# Altium footprint library MYLIB.PcbLib: 600 footprints (part 7 of 39)
Each footprint in its own frame and in the unit in brackets; x right, y up, seen from the top. Pads: shape width x height; smd on the part's side, far side on the other; paste and mask are expansions set on the pad; w line width, h text height; cw(c..) or ccw(c..) is an arc to the next point about the centre after c.
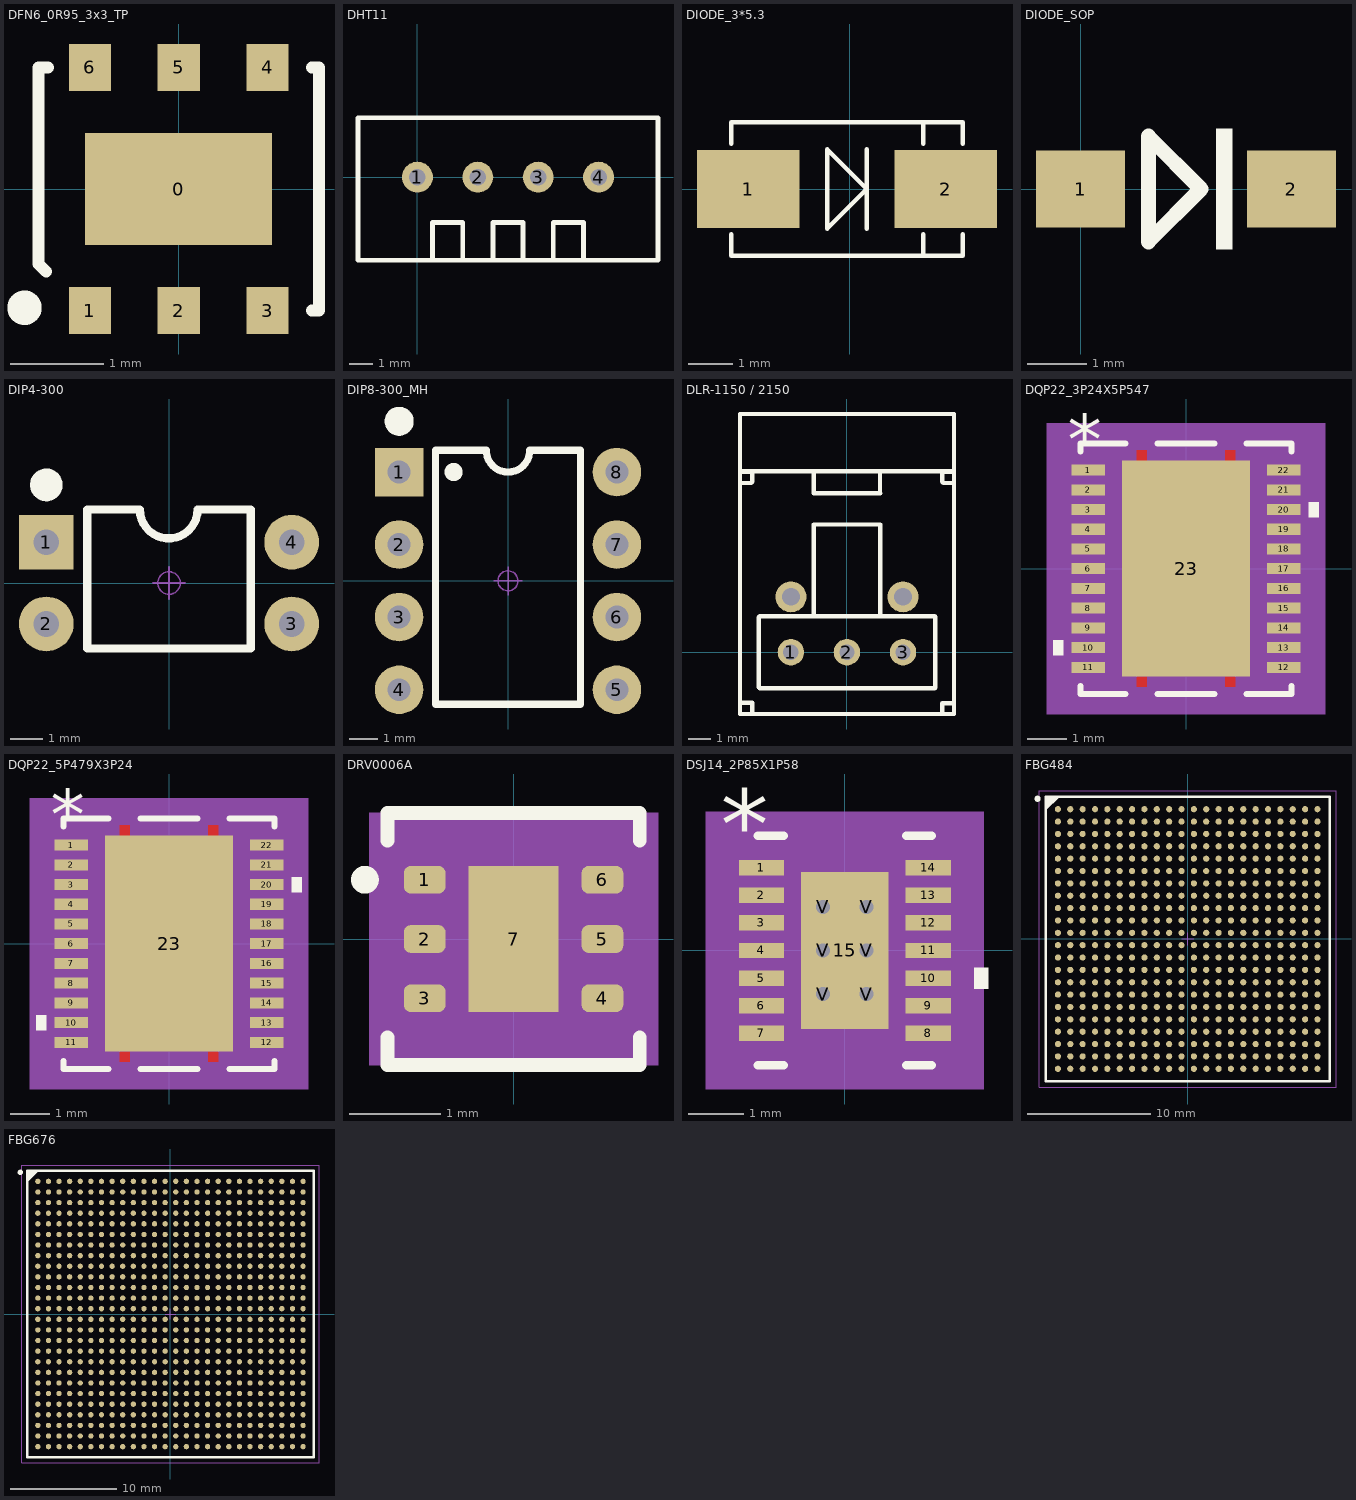
[diagram p6: the footprints below, top view; thin cyan lines are the x and y axes]

## DFN6_0R95_3x3_TP [mm] "500 mA low quiescent current and low noise voltage regulator"
height 1
pads (7):
  rect 2x1.2 smd: 0(0,0)
  rect 0.45x0.5 smd: 1(-0.95,-1.3) 2(0,-1.3) 3(0.95,-1.3) 4(0.95,1.3) 5(0,1.3) 6(-0.95,1.3)
Top Overlay:
  circle w0.25: c-1.649,-1.27 r0.059
  lines w0.127: -1.417,-0.883 -1.5,-0.8 -1.5,1.3 -1.397,1.3 ; 1.422,-1.3 1.5,-1.3 1.5,1.3 1.422,1.3
3D body: height 1, standoff 0.05, extent -1.5,-1.5 1.5,1.5

## DHT11 [mm]
pads (4):
  round 1.3 hole 0.7: 1(0,0) 2(2.54,0) 3(5.08,0) 4(7.62,0)
Top Overlay:
  lines w0.203: -2.5,-3.5 7.62,-3.5 10.12,-3.5 ; -2.5,-3.46 -2.5,0 -2.5,2.5 7.62,2.5 10.12,2.5 10.12,0 10.12,-3.46 ; 0.635,-3.5 0.635,-1.905 1.905,-1.905 1.905,-3.5 ; 3.175,-3.5 3.175,-1.905 4.445,-1.905 4.445,-3.5 ; 5.715,-3.5 5.715,-1.905 6.985,-1.905 6.985,-3.5

## DIODE_3*5.3 [mm]
pads (2):
  rect 2.3x1.75 smd: 1(-2.286,0) 2(2.159,0)
Top Overlay:
  lines w0.1: -2.667,-1.016 -2.667,-1.5 2.54,-1.5 2.54,-1.016 ; -2.667,1.016 -2.667,1.5 2.54,1.5 2.54,1.016 ; 0.381,-0.889 0.381,0.889 ; 1.651,-1.5 1.651,-1.016 ; 1.651,1.016 1.651,1.5 ; -0.508,-0.889 -0.508,0.889 0.381,0 -0.508,-0.889

## DIODE_SOP [mm]
pads (2):
  rect 1.5x1.3 smd: 1(0,0) 2(3.556,0)
Top Overlay:
  rectangle: 2.286,-1.016 2.559,1.016
  lines w0.254: 1.143,-0.889 2.032,0 1.143,0.889 1.143,-0.889

## DIP4-300 [mm] "4.6*7.6*3.8(长宽高）"
pads (4):
  rect 1.7x1.7 hole 0.8: 1(-3.81,1.27)
  round 1.7 hole 0.8: 2(-3.81,-1.27) 3(3.81,-1.27) 4(3.81,1.27)
Top Overlay:
  circle w0.508: c-3.81,3.048 r0.254
  lines w0.254: -2.54,-2.032 2.54,-2.032 2.54,2.286 0.889,2.286 cw(c-0.009,2.286) -0.907,2.286 -2.54,2.286 -2.54,-2.032
Mechanical 15:
  circle w0.05: c0,0 r0.35
  lines w0.05: -0.5,0 0.5,0 ; 0,-0.5 0,0.5
3D body "DIP4-300.STEP": height 4.5, standoff -3.29, extent -3.935,-2.29 3.935,2.29

## DIP8-300_MH [mm] "带底座 9.4*7.6*3.8(长宽高）"
pads (8):
  rect 1.7x1.7 hole 0.8: 1(-3.81,3.81)
  round 1.7 hole 0.8: 2(-3.81,1.27) 3(-3.81,-1.27) 4(-3.81,-3.81) 5(3.81,-3.81) 6(3.81,-1.27) 7(3.81,1.27) 8(3.81,3.81)
Top Overlay:
  circle w0.508: c-3.81,5.588 r0.254
  circle w0.381: c-1.905,3.81 r0.127
  lines w0.254: -2.54,-4.318 -2.54,4.572 -0.762,4.572 ccw(c0,4.572) 0,3.81 ccw(c0,4.572) 0.762,4.572 2.54,4.572 2.54,-4.318 -2.54,-4.318
Mechanical 15:
  circle w0.05: c0,0 r0.35
  lines w0.05: -0.5,0 0.5,0 ; 0,-0.5 0,0.5
3D body "DIP8-300.STEP": height 7.7, standoff 0, extent -3.925,-4.7 3.925,4.7
3D body "DIP-MH8-300.STEP": height 4.95, standoff -2.95, extent -5,-5.19 5,5.19

## DLR-1150 / 2150 [mm]
pads (5):
  round 1.2 hole 0.7: 1(-2.54,0) 2(0,0) 3(2.54,0)
  round 1.4 hole 0.8: ""(-2.54,2.51) ""(2.54,2.51)
Top Overlay:
  lines w0.2: -4.85,8.2 4.85,8.2 ; -4.801,8.179 -4.318,8.179 -4.293,8.153 -4.293,7.722 -4.343,7.671 -4.75,7.671 ; -4.75,-2.286 -4.293,-2.286 -4.293,-2.718 ; -1.5,7.2 1.5,7.2 ; -1.499,1.626 -1.499,5.791 1.5,5.791 1.5,1.626 ; -1.499,7.2 -1.499,8.204 ; 1.499,7.2 1.499,8.204 ; 3.988,1.626 -3.962,1.626 -4,1.588 -4,-1.588 -3.962,-1.626 3.988,-1.626 4,-1.613 4,1.6 ; 4.318,-2.794 4.318,-2.311 4.851,-2.311 ; 4.75,7.671 4.369,7.671 4.318,7.722 4.318,8.153 4.343,8.179 4.826,8.179 ; -4.85,-2.8 4.85,-2.8 4.85,10.8 -4.85,10.8 -4.85,-2.8

## DQP22_3P24X5P547 [mm]
pads (23):
  rect 0.85x0.28 smd: 1(-2.475,2.5) 2(-2.475,2) 3(-2.475,1.5) 4(-2.475,1) 5(-2.475,0.5) 6(-2.475,0) 7(-2.475,-0.5) 8(-2.475,-1) 9(-2.475,-1.5) 10(-2.475,-2) 11(-2.475,-2.5) 12(2.475,-2.5) 13(2.475,-2) 14(2.475,-1.5) 15(2.475,-1) 16(2.475,-0.5) 17(2.475,0) 18(2.475,0.5) 19(2.475,1) 20(2.475,1.5) 21(2.475,2) 22(2.475,2.5)
  rect 3.24x5.479 smd paste-2.727 mask-2.73: 23(0,0)
Top Layer:
  region: 1.25,-2.739 1,-2.739 1,-3 1.25,-3
  region: -1.25,-2.739 -1,-2.739 -1,-3 -1.25,-3
  region: -1.25,2.739 -1,2.739 -1,3 -1.25,3
  region: 1.25,2.739 1,2.739 1,3 1.25,3
  region: 0,-2.739
  region: 0,2.739
Top Overlay:
  region: 3.109,1.69 3.363,1.69 3.363,1.309 3.109,1.309
  region: -3.109,-1.81 -3.363,-1.81 -3.363,-2.191 -3.109,-2.191
  lines w0.152: -2.677,-2.973 -2.677,-3.177 -1.531,-3.177 ; -2.677,2.973 -2.677,3.177 -1.531,3.177 ; -0.719,-3.177 0.719,-3.177 ; -0.719,3.177 0.719,3.177 ; 1.531,-3.177 2.677,-3.177 2.677,-2.973 ; 1.531,3.177 2.677,3.177 2.677,2.973
  text "*" at -3.001,2.653 h1.27
Top Paste:
  drawing of 63 lines, arcs and shapes, not listed
Top Solder:
  drawing of 40 lines, arcs and shapes, not listed
Mechanical 5:
  region: 3.535,-3.685 -3.535,-3.685 -3.535,3.685 3.535,3.685
Mechanical 13:
  lines w0: -0.305,3.05 ccw(c0,3.05) 0.305,3.05
  lines w0.025: -2.55,-2.625 -2.55,-2.625 ; -2.55,-2.625 -2.55,-2.375 ; -2.55,-2.625 -2.55,-2.375 ; -2.55,-2.375 -2.55,-2.375 ; -2.55,-2.125 -2.55,-2.125 ; -2.55,-2.125 -2.55,-1.875 ; -2.55,-2.125 -2.55,-1.875 ; -2.55,-1.875 -2.55,-1.875 ; -2.55,-1.625 -2.55,-1.625 ; -2.55,-1.625 -2.55,-1.375 ; -2.55,-1.625 -2.55,-1.375 ; -2.55,-1.375 -2.55,-1.375 ; -2.55,-1.125 -2.55,-1.125 ; -2.55,-1.125 -2.55,-0.875 ; -2.55,-1.125 -2.55,-0.875 ; -2.55,-0.875 -2.55,-0.875 ; -2.55,-0.625 -2.55,-0.625 ; -2.55,-0.625 -2.55,-0.375 ; -2.55,-0.625 -2.55,-0.375 ; -2.55,-0.375 -2.55,-0.375 ; -2.55,-0.125 -2.55,-0.125 ; -2.55,-0.125 -2.55,0.125 ; -2.55,-0.125 -2.55,0.125 ; -2.55,0.125 -2.55,0.125 ; -2.55,0.375 -2.55,0.375 ; -2.55,0.375 -2.55,0.625 ; -2.55,0.375 -2.55,0.625 ; -2.55,0.625 -2.55,0.625 ; -2.55,0.875 -2.55,0.875 ; -2.55,0.875 -2.55,1.125 ; -2.55,0.875 -2.55,1.125 ; -2.55,1.125 -2.55,1.125 ; -2.55,1.375 -2.55,1.375 ; -2.55,1.375 -2.55,1.625 ; -2.55,1.375 -2.55,1.625 ; -2.55,1.625 -2.55,1.625 ; -2.55,1.875 -2.55,1.875 ; -2.55,1.875 -2.55,2.125 ; -2.55,1.875 -2.55,2.125 ; -2.55,2.125 -2.55,2.125 ; -2.55,2.375 -2.55,2.375 ; -2.55,2.375 -2.55,2.625 ; -2.55,2.375 -2.55,2.625 ; -2.55,2.625 -2.55,2.625 ; 2.55,-2.625 2.55,-2.375 ; 2.55,-2.625 2.55,-2.625 ; 2.55,-2.625 2.55,-2.375 ; 2.55,-2.375 2.55,-2.375 ; 2.55,-2.125 2.55,-1.875 ; 2.55,-2.125 2.55,-2.125 ; 2.55,-2.125 2.55,-1.875 ; 2.55,-1.875 2.55,-1.875 ; 2.55,-1.625 2.55,-1.375 ; 2.55,-1.625 2.55,-1.625 ; 2.55,-1.625 2.55,-1.375 ; 2.55,-1.375 2.55,-1.375 ; 2.55,-1.125 2.55,-0.875 ; 2.55,-1.125 2.55,-1.125 ; 2.55,-1.125 2.55,-0.875 ; 2.55,-0.875 2.55,-0.875 ; 2.55,-0.625 2.55,-0.375 ; 2.55,-0.625 2.55,-0.625 ; 2.55,-0.625 2.55,-0.375 ; 2.55,-0.375 2.55,-0.375 ; 2.55,-0.125 2.55,0.125 ; 2.55,-0.125 2.55,-0.125 ; 2.55,-0.125 2.55,0.125 ; 2.55,0.125 2.55,0.125 ; 2.55,0.375 2.55,0.625 ; 2.55,0.375 2.55,0.375 ; 2.55,0.375 2.55,0.625 ; 2.55,0.625 2.55,0.625 ; 2.55,0.875 2.55,1.125 ; 2.55,0.875 2.55,0.875 ; 2.55,0.875 2.55,1.125 ; 2.55,1.125 2.55,1.125 ; 2.55,1.375 2.55,1.625 ; 2.55,1.375 2.55,1.375 ; 2.55,1.375 2.55,1.625 ; 2.55,1.625 2.55,1.625 ; 2.55,1.875 2.55,2.125 ; 2.55,1.875 2.55,1.875 ; 2.55,1.875 2.55,2.125 ; 2.55,2.125 2.55,2.125 ; 2.55,2.375 2.55,2.625 ; 2.55,2.375 2.55,2.375 ; 2.55,2.375 2.55,2.625 ; 2.55,2.625 2.55,2.625 ; -2.55,-3.05 -2.55,3.05 2.55,3.05 2.55,-3.05 -2.55,-3.05
  text "*" at -2.613,1.51 h1.27
Mechanical 15:
  region: -2.804,-2.894 -3.154,-2.894 -3.154,2.894 -2.804,2.894 -2.804,3.304 2.804,3.304 2.804,2.894 3.154,2.894 3.154,-2.894 2.804,-2.894 2.804,-3.304 -2.804,-3.304
  lines w0.152: -3.154,-2.894 -2.804,-2.894 -2.804,-3.304 2.804,-3.304 2.804,-2.894 3.154,-2.894 3.154,2.894 2.804,2.894 2.804,3.304 -2.804,3.304 -2.804,2.894 -3.154,2.894 -3.154,-2.894
Mechanical 16:
  circle w0.127: c1.181,1.968 r0.191
  circle w0.127: c1.181,1.181 r0.191
  circle w0.127: c1.181,0.394 r0.191
  circle w0.127: c1.181,-0.394 r0.191
  circle w0.127: c1.181,-1.181 r0.191
  circle w0.127: c1.181,-1.968 r0.191
  circle w0.127: c0.394,1.968 r0.191
  circle w0.127: c0.394,1.181 r0.191
  circle w0.127: c0.394,0.394 r0.191
  circle w0.127: c0.394,-0.394 r0.191
  circle w0.127: c0.394,-1.181 r0.191
  circle w0.127: c0.394,-1.968 r0.191
  circle w0.127: c-0.394,1.968 r0.191
  circle w0.127: c-0.394,1.181 r0.191
  circle w0.127: c-0.394,0.394 r0.191
  circle w0.127: c-0.394,-0.394 r0.191
  circle w0.127: c-0.394,-1.181 r0.191
  circle w0.127: c-0.394,-1.968 r0.191
  circle w0.127: c-1.181,1.968 r0.191
  circle w0.127: c-1.181,1.181 r0.191
  circle w0.127: c-1.181,0.394 r0.191
  circle w0.127: c-1.181,-0.394 r0.191
  circle w0.127: c-1.181,-1.181 r0.191
  circle w0.127: c-1.181,-1.968 r0.191
3D body: height 0.25, standoff 0, extent 0,0 0.254,0.254

## DQP22_5P479X3P24 [mm]
pads (23):
  rect 0.85x0.28 smd: 1(-2.475,2.5) 2(-2.475,2) 3(-2.475,1.5) 4(-2.475,1) 5(-2.475,0.5) 6(-2.475,0) 7(-2.475,-0.5) 8(-2.475,-1) 9(-2.475,-1.5) 10(-2.475,-2) 11(-2.475,-2.5) 12(2.475,-2.5) 13(2.475,-2) 14(2.475,-1.5) 15(2.475,-1) 16(2.475,-0.5) 17(2.475,0) 18(2.475,0.5) 19(2.475,1) 20(2.475,1.5) 21(2.475,2) 22(2.475,2.5)
  rect 3.24x5.479 smd paste-2.727 mask-2.73: 23(0,0)
Top Layer:
  region: 0,2.739
  region: 0,-2.739
  region: 1.25,2.739 1,2.739 1,3 1.25,3
  region: -1.25,2.739 -1,2.739 -1,3 -1.25,3
  region: -1.25,-2.739 -1,-2.739 -1,-3 -1.25,-3
  region: 1.25,-2.739 1,-2.739 1,-3 1.25,-3
Top Overlay:
  region: -3.109,-1.81 -3.363,-1.81 -3.363,-2.191 -3.109,-2.191
  region: 3.109,1.69 3.363,1.69 3.363,1.309 3.109,1.309
  lines w0.152: -2.677,-2.973 -2.677,-3.177 -1.531,-3.177 ; -2.677,2.973 -2.677,3.177 -1.531,3.177 ; -0.719,-3.177 0.719,-3.177 ; -0.719,3.177 0.719,3.177 ; 1.531,-3.177 2.677,-3.177 2.677,-2.973 ; 1.531,3.177 2.677,3.177 2.677,2.973
  text "*" at -3.001,2.653 h1.27
Top Paste:
  drawing of 63 lines, arcs and shapes, not listed
Top Solder:
  drawing of 40 lines, arcs and shapes, not listed
Mechanical 5:
  region: 3.535,-3.685 -3.535,-3.685 -3.535,3.685 3.535,3.685
Mechanical 13:
  lines w0: -0.305,3.05 ccw(c0,3.05) 0.305,3.05
  lines w0.025: -2.55,-2.625 -2.55,-2.375 ; -2.55,-2.625 -2.55,-2.375 ; -2.55,-2.625 -2.55,-2.625 ; -2.55,-2.375 -2.55,-2.375 ; -2.55,-2.125 -2.55,-1.875 ; -2.55,-2.125 -2.55,-1.875 ; -2.55,-2.125 -2.55,-2.125 ; -2.55,-1.875 -2.55,-1.875 ; -2.55,-1.625 -2.55,-1.375 ; -2.55,-1.625 -2.55,-1.375 ; -2.55,-1.625 -2.55,-1.625 ; -2.55,-1.375 -2.55,-1.375 ; -2.55,-1.125 -2.55,-0.875 ; -2.55,-1.125 -2.55,-0.875 ; -2.55,-1.125 -2.55,-1.125 ; -2.55,-0.875 -2.55,-0.875 ; -2.55,-0.625 -2.55,-0.375 ; -2.55,-0.625 -2.55,-0.375 ; -2.55,-0.625 -2.55,-0.625 ; -2.55,-0.375 -2.55,-0.375 ; -2.55,-0.125 -2.55,0.125 ; -2.55,-0.125 -2.55,0.125 ; -2.55,-0.125 -2.55,-0.125 ; -2.55,0.125 -2.55,0.125 ; -2.55,0.375 -2.55,0.625 ; -2.55,0.375 -2.55,0.625 ; -2.55,0.375 -2.55,0.375 ; -2.55,0.625 -2.55,0.625 ; -2.55,0.875 -2.55,1.125 ; -2.55,0.875 -2.55,1.125 ; -2.55,0.875 -2.55,0.875 ; -2.55,1.125 -2.55,1.125 ; -2.55,1.375 -2.55,1.625 ; -2.55,1.375 -2.55,1.625 ; -2.55,1.375 -2.55,1.375 ; -2.55,1.625 -2.55,1.625 ; -2.55,1.875 -2.55,2.125 ; -2.55,1.875 -2.55,2.125 ; -2.55,1.875 -2.55,1.875 ; -2.55,2.125 -2.55,2.125 ; -2.55,2.375 -2.55,2.625 ; -2.55,2.375 -2.55,2.625 ; -2.55,2.375 -2.55,2.375 ; -2.55,2.625 -2.55,2.625 ; 2.55,-2.625 2.55,-2.375 ; 2.55,-2.625 2.55,-2.625 ; 2.55,-2.625 2.55,-2.375 ; 2.55,-2.375 2.55,-2.375 ; 2.55,-2.125 2.55,-1.875 ; 2.55,-2.125 2.55,-2.125 ; 2.55,-2.125 2.55,-1.875 ; 2.55,-1.875 2.55,-1.875 ; 2.55,-1.625 2.55,-1.375 ; 2.55,-1.625 2.55,-1.625 ; 2.55,-1.625 2.55,-1.375 ; 2.55,-1.375 2.55,-1.375 ; 2.55,-1.125 2.55,-0.875 ; 2.55,-1.125 2.55,-1.125 ; 2.55,-1.125 2.55,-0.875 ; 2.55,-0.875 2.55,-0.875 ; 2.55,-0.625 2.55,-0.375 ; 2.55,-0.625 2.55,-0.625 ; 2.55,-0.625 2.55,-0.375 ; 2.55,-0.375 2.55,-0.375 ; 2.55,-0.125 2.55,0.125 ; 2.55,-0.125 2.55,-0.125 ; 2.55,-0.125 2.55,0.125 ; 2.55,0.125 2.55,0.125 ; 2.55,0.375 2.55,0.625 ; 2.55,0.375 2.55,0.375 ; 2.55,0.375 2.55,0.625 ; 2.55,0.625 2.55,0.625 ; 2.55,0.875 2.55,1.125 ; 2.55,0.875 2.55,0.875 ; 2.55,0.875 2.55,1.125 ; 2.55,1.125 2.55,1.125 ; 2.55,1.375 2.55,1.625 ; 2.55,1.375 2.55,1.375 ; 2.55,1.375 2.55,1.625 ; 2.55,1.625 2.55,1.625 ; 2.55,1.875 2.55,2.125 ; 2.55,1.875 2.55,1.875 ; 2.55,1.875 2.55,2.125 ; 2.55,2.125 2.55,2.125 ; 2.55,2.375 2.55,2.625 ; 2.55,2.375 2.55,2.375 ; 2.55,2.375 2.55,2.625 ; 2.55,2.625 2.55,2.625 ; -2.55,-3.05 2.55,-3.05 2.55,3.05 -2.55,3.05 -2.55,-3.05
  text "*" at -2.613,1.51 h1.27
Mechanical 15:
  region: -2.804,-2.894 -3.154,-2.894 -3.154,2.894 -2.804,2.894 -2.804,3.304 2.804,3.304 2.804,2.894 3.154,2.894 3.154,-2.894 2.804,-2.894 2.804,-3.304 -2.804,-3.304
  lines w0.152: -3.154,-2.894 -3.154,2.894 -2.804,2.894 -2.804,3.304 2.804,3.304 2.804,2.894 3.154,2.894 3.154,-2.894 2.804,-2.894 2.804,-3.304 -2.804,-3.304 -2.804,-2.894 -3.154,-2.894
Mechanical 16:
  circle w0.127: c-1.181,-1.968 r0.191
  circle w0.127: c-1.181,-1.181 r0.191
  circle w0.127: c-1.181,-0.394 r0.191
  circle w0.127: c-1.181,0.394 r0.191
  circle w0.127: c-1.181,1.181 r0.191
  circle w0.127: c-1.181,1.968 r0.191
  circle w0.127: c-0.394,-1.968 r0.191
  circle w0.127: c-0.394,-1.181 r0.191
  circle w0.127: c-0.394,-0.394 r0.191
  circle w0.127: c-0.394,0.394 r0.191
  circle w0.127: c-0.394,1.181 r0.191
  circle w0.127: c-0.394,1.968 r0.191
  circle w0.127: c0.394,-1.968 r0.191
  circle w0.127: c0.394,-1.181 r0.191
  circle w0.127: c0.394,-0.394 r0.191
  circle w0.127: c0.394,0.394 r0.191
  circle w0.127: c0.394,1.181 r0.191
  circle w0.127: c0.394,1.968 r0.191
  circle w0.127: c1.181,-1.968 r0.191
  circle w0.127: c1.181,-1.181 r0.191
  circle w0.127: c1.181,-0.394 r0.191
  circle w0.127: c1.181,0.394 r0.191
  circle w0.127: c1.181,1.181 r0.191
  circle w0.127: c1.181,1.968 r0.191
3D body: height 0.25, standoff 0, extent 0,0 0.254,0.254

## DRV0006A [mil]
pads (7):
  rrect50% 18x12 smd paste+0 mask+2: 1(-38.39,25.59) 2(-38.39,0) 3(-38.39,-25.59) 4(38.39,-25.59) 5(38.39,0) 6(38.39,25.59)
  rect 39x63 smd paste-31 mask-31: 7(0,0)
Top Layer:
  region: 0,31.5
  region: 0,-31.5
Top Overlay:
  circle w6: c-64.18,25.59 r3
  lines w6: -54.5,-42.59 -54.5,-54.5 54.5,-54.5 54.5,-42.59 ; -54.5,42.59 -54.5,54.5 54.5,54.5 54.5,42.59
Top Paste:
  region: -29.39,31.59 -47.39,31.59 -47.39,19.59 -29.39,19.59
  region: -29.39,6 -47.39,6 -47.39,-6 -29.39,-6
  region: -29.39,-19.59 -47.39,-19.59 -47.39,-31.59 -29.39,-31.59
  region: 47.39,-19.59 29.39,-19.59 29.39,-31.59 47.39,-31.59
  region: 47.39,6 29.39,6 29.39,-6 47.39,-6
  region: 47.39,31.59 29.39,31.59 29.39,19.59 47.39,19.59
  region: -3.94,28.55 -16.55,28.55 -16.55,19.44 -9.5,19.44 -3.94,25
  region: -9.5,11.56 -16.55,11.56 -16.55,-11.56 -9.5,-11.56 -3.94,-6 -3.94,6
  region: -9.5,-19.44 -16.55,-19.44 -16.55,-28.55 -3.94,-28.55 -3.94,-25
  region: 16.55,28.55 3.94,28.55 3.94,25 9.5,19.44 16.55,19.44
  region: 16.55,11.56 9.5,11.56 3.94,6 3.94,-6 9.5,-11.56 16.55,-11.56
  region: 16.55,-19.44 9.5,-19.44 3.94,-25 3.94,-28.55 16.55,-28.55
Top Solder:
  region: -29.39,31.59 -47.39,31.59 -47.39,19.59 -29.39,19.59
  region: -29.39,6 -47.39,6 -47.39,-6 -29.39,-6
  region: -29.39,-19.59 -47.39,-19.59 -47.39,-31.59 -29.39,-31.59
  region: 47.39,-19.59 29.39,-19.59 29.39,-31.59 47.39,-31.59
  region: 47.39,6 29.39,6 29.39,-6 47.39,-6
  region: 47.39,31.59 29.39,31.59 29.39,19.59 47.39,19.59
  region: -22,23.37 -22,34 22,34 22,23.37
  region: -22,-7.63 -22,7.63 22,7.63 22,-7.63
  region: -22,-34 -22,-23.37 22,-23.37 22,-34
  region: -22,-34 -22,34 -7.87,34 -7.87,-34
  region: 7.87,-34 7.87,34 22,34 22,-34
  region: 0,31.5
  region: 0,-31.5
Mechanical 5:
  region: 62.39,-54.5 -62.39,-54.5 -62.39,54.5 62.39,54.5
Mechanical 13:
  circle w0: c-29.39,25.59 r3
  lines w0: -12,39.5 ccw(c0,39.5) 12,39.5
  lines w1: -39.5,-39.5 39.5,-39.5 39.5,39.5 -39.5,39.5 -39.5,-39.5
Mechanical 15:
  region: -49.5,-40.39 -57.39,-40.39 -57.39,40.39 -49.5,40.39 -49.5,49.5 49.5,49.5 49.5,40.39 57.39,40.39 57.39,-40.39 49.5,-40.39 49.5,-49.5 -49.5,-49.5
  lines w6: -57.39,-40.39 -57.39,40.39 -49.5,40.39 -49.5,49.5 49.5,49.5 49.5,40.39 57.39,40.39 57.39,-40.39 49.5,-40.39 49.5,-49.5 -49.5,-49.5 -49.5,-40.39 -57.39,-40.39
Mechanical 16:
  circle w0: c0,-21.66 r4
  circle w0: c0,21.66 r4
3D body: height 10, standoff 0, extent 0,0 10,10

## DSJ14_2P85X1P58 [mm]
pads (21):
  rect 0.82x0.28 smd paste-0.397: 1(-1.51,1.5) 2(-1.51,1) 3(-1.51,0.5) 4(-1.51,0) 5(-1.51,-0.5) 6(-1.51,-1) 7(-1.51,-1.5) 8(1.51,-1.5) 9(1.51,-1) 10(1.51,-0.5) 11(1.51,0) 12(1.51,0.5) 13(1.51,1) 14(1.51,1.5)
  rect 1.58x2.85 smd paste-1.412 mask-1.41: 15(0,0)
  round 0.508 hole 0.254: V(-0.394,-0.787) V(-0.394,0) V(-0.394,0.787) V(0.394,-0.787) V(0.394,0) V(0.394,0.787)
Top Overlay:
  region: 2.337,-0.309 2.591,-0.309 2.591,-0.69 2.337,-0.69
  lines w0.152: -1.575,-2.075 -1.11,-2.075 ; -1.575,2.075 -1.11,2.075 ; 1.11,-2.075 1.575,-2.075 ; 1.11,2.075 1.575,2.075
  text "*" at -2.244,1.653 h1.27
Top Paste:
  drawing of 26 lines, arcs and shapes, not listed
Top Solder:
  region: 0.594,-1.488 0.594,1.488 0.854,1.488 0.854,-1.488
  region: 0.194,-1.488 0.194,1.488 -0.194,1.488 -0.194,-1.488
  region: -0.854,-1.488 -0.854,1.488 -0.594,1.488 -0.594,-1.488
  region: -0.854,-1.488 -0.854,-0.987 0.854,-0.987 0.854,-1.488
  region: -0.854,-0.587 -0.854,-0.2 0.854,-0.2 0.854,-0.587
  region: -0.854,0.2 -0.854,0.587 0.854,0.587 0.854,0.2
  region: -0.854,0.987 -0.854,1.488 0.854,1.488 0.854,0.987
  region: 1.92,1.64 1.1,1.64 1.1,1.36 1.92,1.36
  region: 1.92,1.14 1.1,1.14 1.1,0.86 1.92,0.86
  region: 1.92,0.64 1.1,0.64 1.1,0.36 1.92,0.36
  region: 1.92,0.14 1.1,0.14 1.1,-0.14 1.92,-0.14
  region: 1.92,-0.36 1.1,-0.36 1.1,-0.64 1.92,-0.64
  region: 1.92,-0.86 1.1,-0.86 1.1,-1.14 1.92,-1.14
  region: 1.92,-1.36 1.1,-1.36 1.1,-1.64 1.92,-1.64
  region: -1.1,-1.36 -1.92,-1.36 -1.92,-1.64 -1.1,-1.64
  region: -1.1,-0.86 -1.92,-0.86 -1.92,-1.14 -1.1,-1.14
  region: -1.1,-0.36 -1.92,-0.36 -1.92,-0.64 -1.1,-0.64
  region: -1.1,0.14 -1.92,0.14 -1.92,-0.14 -1.1,-0.14
  region: -1.1,0.64 -1.92,0.64 -1.92,0.36 -1.1,0.36
  region: -1.1,1.14 -1.92,1.14 -1.92,0.86 -1.1,0.86
  region: -1.1,1.64 -1.92,1.64 -1.92,1.36 -1.1,1.36
Mechanical 5:
  region: 2.515,-2.507 -2.515,-2.507 -2.515,2.507 2.515,2.507
Mechanical 13:
  lines w0: -0.305,2.075 ccw(c0,2.075) 0.305,2.075
  lines w0.025: -1.575,-2.075 -1.575,2.075 1.575,2.075 1.575,-2.075 -1.575,-2.075 ; -1.575,-1.65 -1.575,-1.35 -1.575,-1.65 ; -1.575,-1.15 -1.575,-0.85 -1.575,-1.15 ; -1.575,-0.65 -1.575,-0.35 -1.575,-0.65 ; -1.575,-0.15 -1.575,0.15 -1.575,-0.15 ; -1.575,0.35 -1.575,0.65 -1.575,0.35 ; -1.575,0.85 -1.575,1.15 -1.575,0.85 ; -1.575,1.35 -1.575,1.65 -1.575,1.35 ; 1.575,-1.65 1.575,-1.35 1.575,-1.65 ; 1.575,-1.15 1.575,-0.85 1.575,-1.15 ; 1.575,-0.65 1.575,-0.35 1.575,-0.65 ; 1.575,-0.15 1.575,0.15 1.575,-0.15 ; 1.575,0.35 1.575,0.65 1.575,0.35 ; 1.575,0.85 1.575,1.15 1.575,0.85 ; 1.575,1.35 1.575,1.65 1.575,1.35
  text "*" at -2.244,1.653 h1.27
Mechanical 15:
  region: 2.134,-2.126 -2.134,-2.126 -2.134,2.126 2.134,2.126
  lines w0.152: -2.134,-2.126 2.134,-2.126 2.134,2.126 -2.134,2.126 -2.134,-2.126
3D body: height 0.25, standoff 0, extent 0,0 0.254,0.254

## FBG484 [mm] "BGA, 484-Balls, Body 23x23mm, Pitch 1.0mm"
height 2.54
pads (484):
  round 0.5 smd: A1(-10.5,10.5) A2(-9.5,10.5) A3(-8.5,10.5) A4(-7.5,10.5) A5(-6.5,10.5) A6(-5.5,10.5) A7(-4.5,10.5) A8(-3.5,10.5) A9(-2.5,10.5) A10(-1.5,10.5) A11(-0.5,10.5) A12(0.5,10.5) A13(1.5,10.5) A14(2.5,10.5) A15(3.5,10.5) A16(4.5,10.5) A17(5.5,10.5) A18(6.5,10.5) A19(7.5,10.5) A20(8.5,10.5) A21(9.5,10.5) A22(10.5,10.5) AA1(-10.5,-9.5) AA2(-9.5,-9.5) AA3(-8.5,-9.5) AA4(-7.5,-9.5) AA5(-6.5,-9.5) AA6(-5.5,-9.5) AA7(-4.5,-9.5) AA8(-3.5,-9.5) AA9(-2.5,-9.5) AA10(-1.5,-9.5) AA11(-0.5,-9.5) AA12(0.5,-9.5) AA13(1.5,-9.5) AA14(2.5,-9.5) AA15(3.5,-9.5) AA16(4.5,-9.5) AA17(5.5,-9.5) AA18(6.5,-9.5) AA19(7.5,-9.5) AA20(8.5,-9.5) AA21(9.5,-9.5) AA22(10.5,-9.5) AB1(-10.5,-10.5) AB2(-9.5,-10.5) AB3(-8.5,-10.5) AB4(-7.5,-10.5) AB5(-6.5,-10.5) AB6(-5.5,-10.5) AB7(-4.5,-10.5) AB8(-3.5,-10.5) AB9(-2.5,-10.5) AB10(-1.5,-10.5) AB11(-0.5,-10.5) AB12(0.5,-10.5) AB13(1.5,-10.5) AB14(2.5,-10.5) AB15(3.5,-10.5) AB16(4.5,-10.5) AB17(5.5,-10.5) AB18(6.5,-10.5) AB19(7.5,-10.5) AB20(8.5,-10.5) AB21(9.5,-10.5) AB22(10.5,-10.5) B1(-10.5,9.5) B2(-9.5,9.5) B3(-8.5,9.5) B4(-7.5,9.5) B5(-6.5,9.5) B6(-5.5,9.5) B7(-4.5,9.5) B8(-3.5,9.5) B9(-2.5,9.5) B10(-1.5,9.5) B11(-0.5,9.5) B12(0.5,9.5) B13(1.5,9.5) B14(2.5,9.5) B15(3.5,9.5) B16(4.5,9.5) B17(5.5,9.5) B18(6.5,9.5) B19(7.5,9.5) B20(8.5,9.5) B21(9.5,9.5) B22(10.5,9.5) C1(-10.5,8.5) C2(-9.5,8.5) C3(-8.5,8.5) C4(-7.5,8.5) C5(-6.5,8.5) C6(-5.5,8.5) C7(-4.5,8.5) C8(-3.5,8.5) C9(-2.5,8.5) C10(-1.5,8.5) C11(-0.5,8.5) C12(0.5,8.5) C13(1.5,8.5) C14(2.5,8.5) C15(3.5,8.5) C16(4.5,8.5) C17(5.5,8.5) C18(6.5,8.5) C19(7.5,8.5) C20(8.5,8.5) C21(9.5,8.5) C22(10.5,8.5) D1(-10.5,7.5) D2(-9.5,7.5) D3(-8.5,7.5) D4(-7.5,7.5) D5(-6.5,7.5) D6(-5.5,7.5) D7(-4.5,7.5) D8(-3.5,7.5) D9(-2.5,7.5) D10(-1.5,7.5) D11(-0.5,7.5) D12(0.5,7.5) D13(1.5,7.5) D14(2.5,7.5) D15(3.5,7.5) D16(4.5,7.5) D17(5.5,7.5) D18(6.5,7.5) D19(7.5,7.5) D20(8.5,7.5) D21(9.5,7.5) D22(10.5,7.5) E1(-10.5,6.5) E2(-9.5,6.5) E3(-8.5,6.5) E4(-7.5,6.5) E5(-6.5,6.5) E6(-5.5,6.5) E7(-4.5,6.5) E8(-3.5,6.5) E9(-2.5,6.5) E10(-1.5,6.5) E11(-0.5,6.5) E12(0.5,6.5) E13(1.5,6.5) E14(2.5,6.5) E15(3.5,6.5) E16(4.5,6.5) E17(5.5,6.5) E18(6.5,6.5) E19(7.5,6.5) E20(8.5,6.5) E21(9.5,6.5) E22(10.5,6.5) F1(-10.5,5.5) F2(-9.5,5.5) F3(-8.5,5.5) F4(-7.5,5.5) F5(-6.5,5.5) F6(-5.5,5.5) F7(-4.5,5.5) F8(-3.5,5.5) F9(-2.5,5.5) F10(-1.5,5.5) F11(-0.5,5.5) F12(0.5,5.5) F13(1.5,5.5) F14(2.5,5.5) F15(3.5,5.5) F16(4.5,5.5) F17(5.5,5.5) F18(6.5,5.5) F19(7.5,5.5) F20(8.5,5.5) F21(9.5,5.5) F22(10.5,5.5) G1(-10.5,4.5) G2(-9.5,4.5) G3(-8.5,4.5) G4(-7.5,4.5) G5(-6.5,4.5) G6(-5.5,4.5) G7(-4.5,4.5) G8(-3.5,4.5) G9(-2.5,4.5) G10(-1.5,4.5) G11(-0.5,4.5) G12(0.5,4.5) G13(1.5,4.5) G14(2.5,4.5) G15(3.5,4.5) G16(4.5,4.5) G17(5.5,4.5) G18(6.5,4.5) G19(7.5,4.5) G20(8.5,4.5) G21(9.5,4.5) G22(10.5,4.5) H1(-10.5,3.5) H2(-9.5,3.5) H3(-8.5,3.5) H4(-7.5,3.5) H5(-6.5,3.5) H6(-5.5,3.5) H7(-4.5,3.5) H8(-3.5,3.5) H9(-2.5,3.5) H10(-1.5,3.5) H11(-0.5,3.5) H12(0.5,3.5) H13(1.5,3.5) H14(2.5,3.5) H15(3.5,3.5) H16(4.5,3.5) H17(5.5,3.5) H18(6.5,3.5) H19(7.5,3.5) H20(8.5,3.5) H21(9.5,3.5) H22(10.5,3.5) J1(-10.5,2.5) J2(-9.5,2.5) J3(-8.5,2.5) J4(-7.5,2.5) J5(-6.5,2.5) J6(-5.5,2.5) J7(-4.5,2.5) J8(-3.5,2.5) J9(-2.5,2.5) J10(-1.5,2.5) J11(-0.5,2.5) J12(0.5,2.5) J13(1.5,2.5) J14(2.5,2.5) J15(3.5,2.5) J16(4.5,2.5) J17(5.5,2.5) J18(6.5,2.5) J19(7.5,2.5) J20(8.5,2.5) J21(9.5,2.5) J22(10.5,2.5) K1(-10.5,1.5) K2(-9.5,1.5) K3(-8.5,1.5) K4(-7.5,1.5) K5(-6.5,1.5) K6(-5.5,1.5) K7(-4.5,1.5) K8(-3.5,1.5) K9(-2.5,1.5) K10(-1.5,1.5) K11(-0.5,1.5) K12(0.5,1.5) K13(1.5,1.5) K14(2.5,1.5) K15(3.5,1.5) K16(4.5,1.5) K17(5.5,1.5) K18(6.5,1.5) K19(7.5,1.5) K20(8.5,1.5) K21(9.5,1.5) K22(10.5,1.5) L1(-10.5,0.5) L2(-9.5,0.5) L3(-8.5,0.5) L4(-7.5,0.5) L5(-6.5,0.5) L6(-5.5,0.5) L7(-4.5,0.5) L8(-3.5,0.5) L9(-2.5,0.5) L10(-1.5,0.5) L11(-0.5,0.5) L12(0.5,0.5) L13(1.5,0.5) L14(2.5,0.5) L15(3.5,0.5) L16(4.5,0.5) L17(5.5,0.5) L18(6.5,0.5) L19(7.5,0.5) L20(8.5,0.5) L21(9.5,0.5) L22(10.5,0.5) M1(-10.5,-0.5) M2(-9.5,-0.5) M3(-8.5,-0.5) M4(-7.5,-0.5) M5(-6.5,-0.5) M6(-5.5,-0.5) M7(-4.5,-0.5) M8(-3.5,-0.5) M9(-2.5,-0.5) M10(-1.5,-0.5) M11(-0.5,-0.5) M12(0.5,-0.5) M13(1.5,-0.5) M14(2.5,-0.5) M15(3.5,-0.5) M16(4.5,-0.5) M17(5.5,-0.5) M18(6.5,-0.5) M19(7.5,-0.5) M20(8.5,-0.5) M21(9.5,-0.5) M22(10.5,-0.5) N1(-10.5,-1.5) N2(-9.5,-1.5) N3(-8.5,-1.5) N4(-7.5,-1.5) N5(-6.5,-1.5) N6(-5.5,-1.5) N7(-4.5,-1.5) N8(-3.5,-1.5) N9(-2.5,-1.5) N10(-1.5,-1.5) N11(-0.5,-1.5) N12(0.5,-1.5) N13(1.5,-1.5) N14(2.5,-1.5) N15(3.5,-1.5) N16(4.5,-1.5) N17(5.5,-1.5) N18(6.5,-1.5) N19(7.5,-1.5) N20(8.5,-1.5) N21(9.5,-1.5) N22(10.5,-1.5) P1(-10.5,-2.5) P2(-9.5,-2.5) P3(-8.5,-2.5) P4(-7.5,-2.5) P5(-6.5,-2.5) P6(-5.5,-2.5) P7(-4.5,-2.5) P8(-3.5,-2.5) P9(-2.5,-2.5) P10(-1.5,-2.5) P11(-0.5,-2.5) P12(0.5,-2.5) P13(1.5,-2.5) P14(2.5,-2.5) P15(3.5,-2.5) P16(4.5,-2.5) P17(5.5,-2.5) P18(6.5,-2.5) P19(7.5,-2.5) P20(8.5,-2.5) P21(9.5,-2.5) P22(10.5,-2.5) R1(-10.5,-3.5) R2(-9.5,-3.5) R3(-8.5,-3.5) R4(-7.5,-3.5) R5(-6.5,-3.5) R6(-5.5,-3.5) R7(-4.5,-3.5) R8(-3.5,-3.5) R9(-2.5,-3.5) R10(-1.5,-3.5) R11(-0.5,-3.5) R12(0.5,-3.5) R13(1.5,-3.5) R14(2.5,-3.5) R15(3.5,-3.5) R16(4.5,-3.5) R17(5.5,-3.5) R18(6.5,-3.5) R19(7.5,-3.5) R20(8.5,-3.5) R21(9.5,-3.5) R22(10.5,-3.5) T1(-10.5,-4.5) T2(-9.5,-4.5) T3(-8.5,-4.5) T4(-7.5,-4.5) T5(-6.5,-4.5) T6(-5.5,-4.5) T7(-4.5,-4.5) T8(-3.5,-4.5) T9(-2.5,-4.5) T10(-1.5,-4.5) T11(-0.5,-4.5) T12(0.5,-4.5) T13(1.5,-4.5) T14(2.5,-4.5) T15(3.5,-4.5) T16(4.5,-4.5) T17(5.5,-4.5) T18(6.5,-4.5) T19(7.5,-4.5) T20(8.5,-4.5) T21(9.5,-4.5) T22(10.5,-4.5) U1(-10.5,-5.5) U2(-9.5,-5.5) U3(-8.5,-5.5) U4(-7.5,-5.5) U5(-6.5,-5.5) U6(-5.5,-5.5) U7(-4.5,-5.5) U8(-3.5,-5.5) U9(-2.5,-5.5) U10(-1.5,-5.5) U11(-0.5,-5.5) U12(0.5,-5.5) U13(1.5,-5.5) U14(2.5,-5.5) U15(3.5,-5.5) U16(4.5,-5.5) U17(5.5,-5.5) U18(6.5,-5.5) U19(7.5,-5.5) U20(8.5,-5.5) U21(9.5,-5.5) U22(10.5,-5.5) V1(-10.5,-6.5) V2(-9.5,-6.5) V3(-8.5,-6.5) V4(-7.5,-6.5) V5(-6.5,-6.5) V6(-5.5,-6.5) V7(-4.5,-6.5) V8(-3.5,-6.5) V9(-2.5,-6.5) V10(-1.5,-6.5) V11(-0.5,-6.5) V12(0.5,-6.5) V13(1.5,-6.5) V14(2.5,-6.5) V15(3.5,-6.5) V16(4.5,-6.5) V17(5.5,-6.5) V18(6.5,-6.5) V19(7.5,-6.5) V20(8.5,-6.5) V21(9.5,-6.5) V22(10.5,-6.5) W1(-10.5,-7.5) W2(-9.5,-7.5) W3(-8.5,-7.5) W4(-7.5,-7.5) W5(-6.5,-7.5) W6(-5.5,-7.5) W7(-4.5,-7.5) W8(-3.5,-7.5) W9(-2.5,-7.5) W10(-1.5,-7.5) W11(-0.5,-7.5) W12(0.5,-7.5) W13(1.5,-7.5) W14(2.5,-7.5) W15(3.5,-7.5) W16(4.5,-7.5) W17(5.5,-7.5) W18(6.5,-7.5) W19(7.5,-7.5) W20(8.5,-7.5) W21(9.5,-7.5) W22(10.5,-7.5) Y1(-10.5,-8.5) Y2(-9.5,-8.5) Y3(-8.5,-8.5) Y4(-7.5,-8.5) Y5(-6.5,-8.5) Y6(-5.5,-8.5) Y7(-4.5,-8.5) Y8(-3.5,-8.5) Y9(-2.5,-8.5) Y10(-1.5,-8.5) Y11(-0.5,-8.5) Y12(0.5,-8.5) Y13(1.5,-8.5) Y14(2.5,-8.5) Y15(3.5,-8.5) Y16(4.5,-8.5) Y17(5.5,-8.5) Y18(6.5,-8.5) Y19(7.5,-8.5) Y20(8.5,-8.5) Y21(9.5,-8.5) Y22(10.5,-8.5)
Top Overlay:
  circle w0.25: c-12.15,11.35 r0.125
  region: -10.5,11.5 -11.5,10.5 -11.5,11.5
  lines w0.2: -11.5,10.5 -10.5,11.5 ; -11.5,-11.5 11.5,-11.5 11.5,11.5 -11.5,11.5 -11.5,-11.5
Mechanical 13:
  lines w0.1: -11.5,-11.5 11.5,-11.5 11.5,11.5 -11.5,11.5 -11.5,-11.5
Mechanical 15:
  lines w0.05: -12,-12 12,-12 12,12 -12,12 -12,-12
  lines w0.1: -0.5,0 0.5,0 ; 0,-0.5 0,0.5
3D body: height 2.54, standoff 0.4, extent -11.5,-11.5 11.5,11.5

## FBG676 [mm] "BGA, 676-Balls, Body 27x27mm, Pitch 1.0mm"
height 2.54
pads (676):
  round 0.5 smd: A1(-12.5,12.5) A2(-11.5,12.5) A3(-10.5,12.5) A4(-9.5,12.5) A5(-8.5,12.5) A6(-7.5,12.5) A7(-6.5,12.5) A8(-5.5,12.5) A9(-4.5,12.5) A10(-3.5,12.5) A11(-2.5,12.5) A12(-1.5,12.5) A13(-0.5,12.5) A14(0.5,12.5) A15(1.5,12.5) A16(2.5,12.5) A17(3.5,12.5) A18(4.5,12.5) A19(5.5,12.5) A20(6.5,12.5) A21(7.5,12.5) A22(8.5,12.5) A23(9.5,12.5) A24(10.5,12.5) A25(11.5,12.5) A26(12.5,12.5) AA1(-12.5,-7.5) AA2(-11.5,-7.5) AA3(-10.5,-7.5) AA4(-9.5,-7.5) AA5(-8.5,-7.5) AA6(-7.5,-7.5) AA7(-6.5,-7.5) AA8(-5.5,-7.5) AA9(-4.5,-7.5) AA10(-3.5,-7.5) AA11(-2.5,-7.5) AA12(-1.5,-7.5) AA13(-0.5,-7.5) AA14(0.5,-7.5) AA15(1.5,-7.5) AA16(2.5,-7.5) AA17(3.5,-7.5) AA18(4.5,-7.5) AA19(5.5,-7.5) AA20(6.5,-7.5) AA21(7.5,-7.5) AA22(8.5,-7.5) AA23(9.5,-7.5) AA24(10.5,-7.5) AA25(11.5,-7.5) AA26(12.5,-7.5) AB1(-12.5,-8.5) AB2(-11.5,-8.5) AB3(-10.5,-8.5) AB4(-9.5,-8.5) AB5(-8.5,-8.5) AB6(-7.5,-8.5) AB7(-6.5,-8.5) AB8(-5.5,-8.5) AB9(-4.5,-8.5) AB10(-3.5,-8.5) AB11(-2.5,-8.5) AB12(-1.5,-8.5) AB13(-0.5,-8.5) AB14(0.5,-8.5) AB15(1.5,-8.5) AB16(2.5,-8.5) AB17(3.5,-8.5) AB18(4.5,-8.5) AB19(5.5,-8.5) AB20(6.5,-8.5) AB21(7.5,-8.5) AB22(8.5,-8.5) AB23(9.5,-8.5) AB24(10.5,-8.5) AB25(11.5,-8.5) AB26(12.5,-8.5) AC1(-12.5,-9.5) AC2(-11.5,-9.5) AC3(-10.5,-9.5) AC4(-9.5,-9.5) AC5(-8.5,-9.5) AC6(-7.5,-9.5) AC7(-6.5,-9.5) AC8(-5.5,-9.5) AC9(-4.5,-9.5) AC10(-3.5,-9.5) AC11(-2.5,-9.5) AC12(-1.5,-9.5) AC13(-0.5,-9.5) AC14(0.5,-9.5) AC15(1.5,-9.5) AC16(2.5,-9.5) AC17(3.5,-9.5) AC18(4.5,-9.5) AC19(5.5,-9.5) AC20(6.5,-9.5) AC21(7.5,-9.5) AC22(8.5,-9.5) AC23(9.5,-9.5) AC24(10.5,-9.5) AC25(11.5,-9.5) AC26(12.5,-9.5) AD1(-12.5,-10.5) AD2(-11.5,-10.5) AD3(-10.5,-10.5) AD4(-9.5,-10.5) AD5(-8.5,-10.5) AD6(-7.5,-10.5) AD7(-6.5,-10.5) AD8(-5.5,-10.5) AD9(-4.5,-10.5) AD10(-3.5,-10.5) AD11(-2.5,-10.5) AD12(-1.5,-10.5) AD13(-0.5,-10.5) AD14(0.5,-10.5) AD15(1.5,-10.5) AD16(2.5,-10.5) AD17(3.5,-10.5) AD18(4.5,-10.5) AD19(5.5,-10.5) AD20(6.5,-10.5) AD21(7.5,-10.5) AD22(8.5,-10.5) AD23(9.5,-10.5) AD24(10.5,-10.5) AD25(11.5,-10.5) AD26(12.5,-10.5) AE1(-12.5,-11.5) AE2(-11.5,-11.5) AE3(-10.5,-11.5) AE4(-9.5,-11.5) AE5(-8.5,-11.5) AE6(-7.5,-11.5) AE7(-6.5,-11.5) AE8(-5.5,-11.5) AE9(-4.5,-11.5) AE10(-3.5,-11.5) AE11(-2.5,-11.5) AE12(-1.5,-11.5) AE13(-0.5,-11.5) AE14(0.5,-11.5) AE15(1.5,-11.5) AE16(2.5,-11.5) AE17(3.5,-11.5) AE18(4.5,-11.5) AE19(5.5,-11.5) AE20(6.5,-11.5) AE21(7.5,-11.5) AE22(8.5,-11.5) AE23(9.5,-11.5) AE24(10.5,-11.5) AE25(11.5,-11.5) AE26(12.5,-11.5) AF1(-12.5,-12.5) AF2(-11.5,-12.5) AF3(-10.5,-12.5) AF4(-9.5,-12.5) AF5(-8.5,-12.5) AF6(-7.5,-12.5) AF7(-6.5,-12.5) AF8(-5.5,-12.5) AF9(-4.5,-12.5) AF10(-3.5,-12.5) AF11(-2.5,-12.5) AF12(-1.5,-12.5) AF13(-0.5,-12.5) AF14(0.5,-12.5) AF15(1.5,-12.5) AF16(2.5,-12.5) AF17(3.5,-12.5) AF18(4.5,-12.5) AF19(5.5,-12.5) AF20(6.5,-12.5) AF21(7.5,-12.5) AF22(8.5,-12.5) AF23(9.5,-12.5) AF24(10.5,-12.5) AF25(11.5,-12.5) AF26(12.5,-12.5) B1(-12.5,11.5) B2(-11.5,11.5) B3(-10.5,11.5) B4(-9.5,11.5) B5(-8.5,11.5) B6(-7.5,11.5) B7(-6.5,11.5) B8(-5.5,11.5) B9(-4.5,11.5) B10(-3.5,11.5) B11(-2.5,11.5) B12(-1.5,11.5) B13(-0.5,11.5) B14(0.5,11.5) B15(1.5,11.5) B16(2.5,11.5) B17(3.5,11.5) B18(4.5,11.5) B19(5.5,11.5) B20(6.5,11.5) B21(7.5,11.5) B22(8.5,11.5) B23(9.5,11.5) B24(10.5,11.5) B25(11.5,11.5) B26(12.5,11.5) C1(-12.5,10.5) C2(-11.5,10.5) C3(-10.5,10.5) C4(-9.5,10.5) C5(-8.5,10.5) C6(-7.5,10.5) C7(-6.5,10.5) C8(-5.5,10.5) C9(-4.5,10.5) C10(-3.5,10.5) C11(-2.5,10.5) C12(-1.5,10.5) C13(-0.5,10.5) C14(0.5,10.5) C15(1.5,10.5) C16(2.5,10.5) C17(3.5,10.5) C18(4.5,10.5) C19(5.5,10.5) C20(6.5,10.5) C21(7.5,10.5) C22(8.5,10.5) C23(9.5,10.5) C24(10.5,10.5) C25(11.5,10.5) C26(12.5,10.5) D1(-12.5,9.5) D2(-11.5,9.5) D3(-10.5,9.5) D4(-9.5,9.5) D5(-8.5,9.5) D6(-7.5,9.5) D7(-6.5,9.5) D8(-5.5,9.5) D9(-4.5,9.5) D10(-3.5,9.5) D11(-2.5,9.5) D12(-1.5,9.5) D13(-0.5,9.5) D14(0.5,9.5) D15(1.5,9.5) D16(2.5,9.5) D17(3.5,9.5) D18(4.5,9.5) D19(5.5,9.5) D20(6.5,9.5) D21(7.5,9.5) D22(8.5,9.5) D23(9.5,9.5) D24(10.5,9.5) D25(11.5,9.5) D26(12.5,9.5) E1(-12.5,8.5) E2(-11.5,8.5) E3(-10.5,8.5) E4(-9.5,8.5) E5(-8.5,8.5) E6(-7.5,8.5) E7(-6.5,8.5) E8(-5.5,8.5) E9(-4.5,8.5) E10(-3.5,8.5) E11(-2.5,8.5) E12(-1.5,8.5) E13(-0.5,8.5) E14(0.5,8.5) E15(1.5,8.5) E16(2.5,8.5) E17(3.5,8.5) E18(4.5,8.5) E19(5.5,8.5) E20(6.5,8.5) E21(7.5,8.5) E22(8.5,8.5) E23(9.5,8.5) E24(10.5,8.5) E25(11.5,8.5) E26(12.5,8.5) F1(-12.5,7.5) F2(-11.5,7.5) F3(-10.5,7.5) F4(-9.5,7.5) F5(-8.5,7.5) F6(-7.5,7.5) F7(-6.5,7.5) F8(-5.5,7.5) F9(-4.5,7.5) F10(-3.5,7.5) F11(-2.5,7.5) F12(-1.5,7.5) F13(-0.5,7.5) F14(0.5,7.5) F15(1.5,7.5) F16(2.5,7.5) F17(3.5,7.5) F18(4.5,7.5) F19(5.5,7.5) F20(6.5,7.5) F21(7.5,7.5) F22(8.5,7.5) F23(9.5,7.5) F24(10.5,7.5) F25(11.5,7.5) F26(12.5,7.5) G1(-12.5,6.5) G2(-11.5,6.5) G3(-10.5,6.5) G4(-9.5,6.5) G5(-8.5,6.5) G6(-7.5,6.5) G7(-6.5,6.5) G8(-5.5,6.5) G9(-4.5,6.5) G10(-3.5,6.5) G11(-2.5,6.5) G12(-1.5,6.5) G13(-0.5,6.5) G14(0.5,6.5) G15(1.5,6.5) G16(2.5,6.5) G17(3.5,6.5) G18(4.5,6.5) G19(5.5,6.5) G20(6.5,6.5) G21(7.5,6.5) G22(8.5,6.5) G23(9.5,6.5) G24(10.5,6.5) G25(11.5,6.5) G26(12.5,6.5) H1(-12.5,5.5) H2(-11.5,5.5) H3(-10.5,5.5) H4(-9.5,5.5) H5(-8.5,5.5) H6(-7.5,5.5) H7(-6.5,5.5) H8(-5.5,5.5) H9(-4.5,5.5) H10(-3.5,5.5) H11(-2.5,5.5) H12(-1.5,5.5) H13(-0.5,5.5) H14(0.5,5.5) H15(1.5,5.5) H16(2.5,5.5) H17(3.5,5.5) H18(4.5,5.5) H19(5.5,5.5) H20(6.5,5.5) H21(7.5,5.5) H22(8.5,5.5) H23(9.5,5.5) H24(10.5,5.5) H25(11.5,5.5) H26(12.5,5.5) J1(-12.5,4.5) J2(-11.5,4.5) J3(-10.5,4.5) J4(-9.5,4.5) J5(-8.5,4.5) J6(-7.5,4.5) J7(-6.5,4.5) J8(-5.5,4.5) J9(-4.5,4.5) J10(-3.5,4.5) J11(-2.5,4.5) J12(-1.5,4.5) J13(-0.5,4.5) J14(0.5,4.5) J15(1.5,4.5) J16(2.5,4.5) J17(3.5,4.5) J18(4.5,4.5) J19(5.5,4.5) J20(6.5,4.5) J21(7.5,4.5) J22(8.5,4.5) J23(9.5,4.5) J24(10.5,4.5) J25(11.5,4.5) J26(12.5,4.5) K1(-12.5,3.5) K2(-11.5,3.5) K3(-10.5,3.5) K4(-9.5,3.5) K5(-8.5,3.5) K6(-7.5,3.5) K7(-6.5,3.5) K8(-5.5,3.5) K9(-4.5,3.5) K10(-3.5,3.5) K11(-2.5,3.5) K12(-1.5,3.5) K13(-0.5,3.5) K14(0.5,3.5) K15(1.5,3.5) K16(2.5,3.5) K17(3.5,3.5) K18(4.5,3.5) K19(5.5,3.5) K20(6.5,3.5) K21(7.5,3.5) K22(8.5,3.5) K23(9.5,3.5) K24(10.5,3.5) K25(11.5,3.5) K26(12.5,3.5) L1(-12.5,2.5) L2(-11.5,2.5) L3(-10.5,2.5) L4(-9.5,2.5) L5(-8.5,2.5) L6(-7.5,2.5) L7(-6.5,2.5) L8(-5.5,2.5) L9(-4.5,2.5) L10(-3.5,2.5) L11(-2.5,2.5) L12(-1.5,2.5) L13(-0.5,2.5) L14(0.5,2.5) L15(1.5,2.5) L16(2.5,2.5) L17(3.5,2.5) L18(4.5,2.5) L19(5.5,2.5) L20(6.5,2.5) L21(7.5,2.5) L22(8.5,2.5) L23(9.5,2.5) L24(10.5,2.5) L25(11.5,2.5) L26(12.5,2.5) M1(-12.5,1.5) M2(-11.5,1.5) M3(-10.5,1.5) M4(-9.5,1.5) M5(-8.5,1.5) M6(-7.5,1.5) M7(-6.5,1.5) M8(-5.5,1.5) M9(-4.5,1.5) M10(-3.5,1.5) M11(-2.5,1.5) M12(-1.5,1.5) M13(-0.5,1.5) M14(0.5,1.5) M15(1.5,1.5) M16(2.5,1.5) M17(3.5,1.5) M18(4.5,1.5) M19(5.5,1.5) M20(6.5,1.5) M21(7.5,1.5) M22(8.5,1.5) M23(9.5,1.5) M24(10.5,1.5) M25(11.5,1.5) M26(12.5,1.5) N1(-12.5,0.5) N2(-11.5,0.5) N3(-10.5,0.5) N4(-9.5,0.5) N5(-8.5,0.5) N6(-7.5,0.5) N7(-6.5,0.5) N8(-5.5,0.5) N9(-4.5,0.5) N10(-3.5,0.5) N11(-2.5,0.5) N12(-1.5,0.5) N13(-0.5,0.5) N14(0.5,0.5) N15(1.5,0.5) N16(2.5,0.5) N17(3.5,0.5) N18(4.5,0.5) N19(5.5,0.5) N20(6.5,0.5) N21(7.5,0.5) N22(8.5,0.5) N23(9.5,0.5) N24(10.5,0.5) N25(11.5,0.5) N26(12.5,0.5) P1(-12.5,-0.5) P2(-11.5,-0.5) P3(-10.5,-0.5) P4(-9.5,-0.5) P5(-8.5,-0.5) P6(-7.5,-0.5) P7(-6.5,-0.5) P8(-5.5,-0.5) P9(-4.5,-0.5) P10(-3.5,-0.5) P11(-2.5,-0.5) P12(-1.5,-0.5) P13(-0.5,-0.5) P14(0.5,-0.5) P15(1.5,-0.5) P16(2.5,-0.5) P17(3.5,-0.5) P18(4.5,-0.5) P19(5.5,-0.5) P20(6.5,-0.5) P21(7.5,-0.5) P22(8.5,-0.5) P23(9.5,-0.5) P24(10.5,-0.5) P25(11.5,-0.5) P26(12.5,-0.5) R1(-12.5,-1.5) R2(-11.5,-1.5) R3(-10.5,-1.5) R4(-9.5,-1.5) R5(-8.5,-1.5) R6(-7.5,-1.5) R7(-6.5,-1.5) R8(-5.5,-1.5) R9(-4.5,-1.5) R10(-3.5,-1.5) R11(-2.5,-1.5) R12(-1.5,-1.5) R13(-0.5,-1.5) R14(0.5,-1.5) R15(1.5,-1.5) R16(2.5,-1.5) R17(3.5,-1.5) R18(4.5,-1.5) R19(5.5,-1.5) R20(6.5,-1.5) R21(7.5,-1.5) R22(8.5,-1.5) R23(9.5,-1.5) R24(10.5,-1.5) R25(11.5,-1.5) R26(12.5,-1.5) T1(-12.5,-2.5) T2(-11.5,-2.5) T3(-10.5,-2.5) T4(-9.5,-2.5) T5(-8.5,-2.5) T6(-7.5,-2.5) T7(-6.5,-2.5) T8(-5.5,-2.5) T9(-4.5,-2.5) T10(-3.5,-2.5) T11(-2.5,-2.5) T12(-1.5,-2.5) T13(-0.5,-2.5) T14(0.5,-2.5) T15(1.5,-2.5) T16(2.5,-2.5) T17(3.5,-2.5) T18(4.5,-2.5) T19(5.5,-2.5) T20(6.5,-2.5) T21(7.5,-2.5) T22(8.5,-2.5) T23(9.5,-2.5) T24(10.5,-2.5) T25(11.5,-2.5) T26(12.5,-2.5) U1(-12.5,-3.5) U2(-11.5,-3.5) U3(-10.5,-3.5) U4(-9.5,-3.5) U5(-8.5,-3.5) U6(-7.5,-3.5) U7(-6.5,-3.5) U8(-5.5,-3.5) U9(-4.5,-3.5) U10(-3.5,-3.5) U11(-2.5,-3.5) U12(-1.5,-3.5) U13(-0.5,-3.5) U14(0.5,-3.5) U15(1.5,-3.5) U16(2.5,-3.5) U17(3.5,-3.5) U18(4.5,-3.5) U19(5.5,-3.5) U20(6.5,-3.5) U21(7.5,-3.5) U22(8.5,-3.5) U23(9.5,-3.5) U24(10.5,-3.5) U25(11.5,-3.5) U26(12.5,-3.5) V1(-12.5,-4.5) V2(-11.5,-4.5) V3(-10.5,-4.5) V4(-9.5,-4.5) V5(-8.5,-4.5) V6(-7.5,-4.5) V7(-6.5,-4.5) V8(-5.5,-4.5) V9(-4.5,-4.5) V10(-3.5,-4.5) V11(-2.5,-4.5) V12(-1.5,-4.5) V13(-0.5,-4.5) V14(0.5,-4.5) V15(1.5,-4.5) V16(2.5,-4.5) V17(3.5,-4.5) V18(4.5,-4.5) V19(5.5,-4.5) V20(6.5,-4.5) V21(7.5,-4.5) V22(8.5,-4.5) V23(9.5,-4.5) V24(10.5,-4.5) V25(11.5,-4.5) V26(12.5,-4.5) W1(-12.5,-5.5) W2(-11.5,-5.5) W3(-10.5,-5.5) W4(-9.5,-5.5) W5(-8.5,-5.5) W6(-7.5,-5.5) W7(-6.5,-5.5) W8(-5.5,-5.5) W9(-4.5,-5.5) W10(-3.5,-5.5) W11(-2.5,-5.5) W12(-1.5,-5.5) W13(-0.5,-5.5) W14(0.5,-5.5) W15(1.5,-5.5) W16(2.5,-5.5) W17(3.5,-5.5) W18(4.5,-5.5) W19(5.5,-5.5) W20(6.5,-5.5) W21(7.5,-5.5) W22(8.5,-5.5) W23(9.5,-5.5) W24(10.5,-5.5) W25(11.5,-5.5) W26(12.5,-5.5) Y1(-12.5,-6.5) Y2(-11.5,-6.5) Y3(-10.5,-6.5) Y4(-9.5,-6.5) Y5(-8.5,-6.5) Y6(-7.5,-6.5) Y7(-6.5,-6.5) Y8(-5.5,-6.5) Y9(-4.5,-6.5) Y10(-3.5,-6.5) Y11(-2.5,-6.5) Y12(-1.5,-6.5) Y13(-0.5,-6.5) Y14(0.5,-6.5) Y15(1.5,-6.5) Y16(2.5,-6.5) Y17(3.5,-6.5) Y18(4.5,-6.5) Y19(5.5,-6.5) Y20(6.5,-6.5) Y21(7.5,-6.5) Y22(8.5,-6.5) Y23(9.5,-6.5) Y24(10.5,-6.5) Y25(11.5,-6.5) Y26(12.5,-6.5)
Top Overlay:
  circle w0.25: c-14.15,13.35 r0.125
  region: -12.5,13.5 -13.5,12.5 -13.5,13.5
  lines w0.2: -13.5,12.5 -12.5,13.5 ; -13.5,-13.5 -13.5,13.5 13.5,13.5 13.5,-13.5 -13.5,-13.5
Mechanical 13:
  lines w0.1: -13.5,-13.5 -13.5,13.5 13.5,13.5 13.5,-13.5 -13.5,-13.5
Mechanical 15:
  lines w0.05: -14,-14 -14,14 14,14 14,-14 -14,-14
  lines w0.1: -0.5,0 0.5,0 ; 0,-0.5 0,0.5
3D body: height 2.54, standoff 0.4, extent -13.5,-13.5 13.5,13.5